# Altium footprint library UP-ROBOT Devices(2013-02-26).PcbLib: 150 footprints (part 6 of 10)
Each footprint in its own frame and in the unit in brackets; x right, y up, seen from the top. Pads: shape width x height; smd on the part's side, far side on the other; paste and mask are expansions set on the pad; w line width, h text height; cw(c..) or ccw(c..) is an arc to the next point about the centre after c.
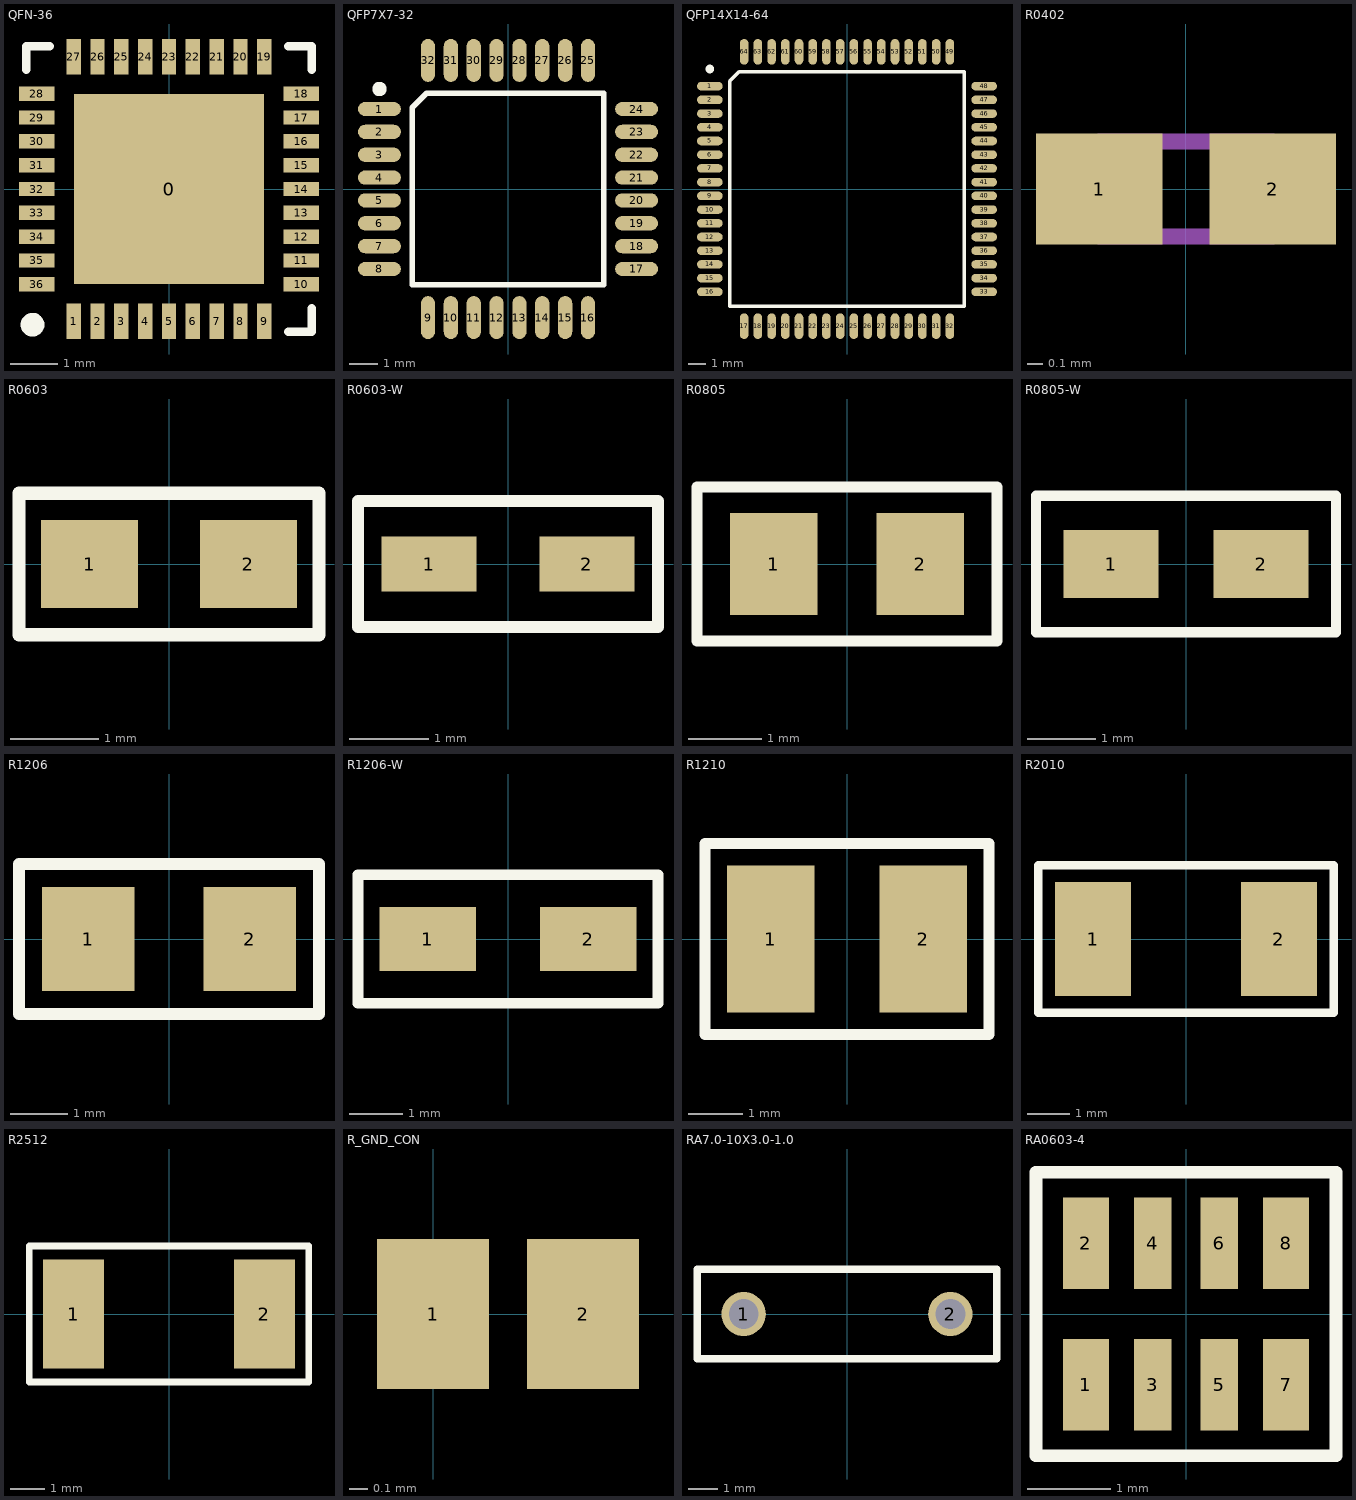
[diagram p5: the footprints below, top view; thin cyan lines are the x and y axes]

## QFN-36 [mm]
pads (37):
  rect 4x4 smd: 0(0,0)
  rect 0.3x0.75 smd: 1(-2,-2.775) 2(-1.5,-2.775) 3(-1,-2.775) 4(-0.5,-2.775) 5(0,-2.775) 6(0.5,-2.775) 7(1,-2.775) 8(1.5,-2.775) 9(2,-2.775) 19(2,2.775) 20(1.5,2.775) 21(1,2.775) 22(0.5,2.775) 23(0,2.775) 24(-0.5,2.775) 25(-1,2.775) 26(-1.5,2.775) 27(-2,2.775)
  rect 0.75x0.3 smd: 10(2.775,-2) 11(2.775,-1.5) 12(2.775,-1) 13(2.775,-0.5) 14(2.775,0) 15(2.775,0.5) 16(2.775,1) 17(2.775,1.5) 18(2.775,2) 28(-2.775,2) 29(-2.775,1.5) 30(-2.775,1) 31(-2.775,0.5) 32(-2.775,0) 33(-2.775,-0.5) 34(-2.775,-1) 35(-2.775,-1.5) 36(-2.775,-2)
Top Overlay:
  circle w0.25: c-2.865,-2.85 r0.125
  lines w0.178: -3,2.5 -3,3 -2.5,3 ; 2.5,-3 3,-3 3,-2.5 ; 2.5,3 3,3 3,2.5
3D body: height 0.9, standoff 0.01, extent -3.102,-3.102 3.103,3.103

## QFP7X7-32 [mm]
pads (32):
  oval 1.5x0.5 smd: 1(-4.5,2.8) 2(-4.5,2) 3(-4.5,1.2) 4(-4.5,0.4) 5(-4.5,-0.4) 6(-4.5,-1.2) 7(-4.5,-2) 8(-4.5,-2.8) 17(4.5,-2.8) 18(4.5,-2) 19(4.5,-1.2) 20(4.5,-0.4) 21(4.5,0.4) 22(4.5,1.2) 23(4.5,2) 24(4.5,2.8)
  oval 0.5x1.5 smd: 9(-2.8,-4.5) 10(-2,-4.5) 11(-1.2,-4.5) 12(-0.4,-4.5) 13(0.4,-4.5) 14(1.2,-4.5) 15(2,-4.5) 16(2.8,-4.5) 25(2.8,4.5) 26(2,4.5) 27(1.2,4.5) 28(0.4,4.5) 29(-0.4,4.5) 30(-1.2,4.5) 31(-2,4.5) 32(-2.8,4.5)
Top Overlay:
  circle w0.25: c-4.5,3.5 r0.125
  lines w0.2: -3.35,-3.35 3.35,-3.35 3.35,3.35 -2.85,3.35 -3.35,2.85 -3.35,-3.35
3D body: height 1.75, standoff -0.06, extent -4.5,-4.492 4.5,4.508

## QFP14X14-64 [mm]
pads (64):
  oval 1.5x0.5 smd: 1(-8,6) 2(-8,5.2) 3(-8,4.4) 4(-8,3.6) 5(-8,2.8) 6(-8,2) 7(-8,1.2) 8(-8,0.4) 9(-8,-0.4) 10(-8,-1.2) 11(-8,-2) 12(-8,-2.8) 13(-8,-3.6) 14(-8,-4.4) 15(-8,-5.2) 16(-8,-6) 33(8,-6) 34(8,-5.2) 35(8,-4.4) 36(8,-3.6) 37(8,-2.8) 38(8,-2) 39(8,-1.2) 40(8,-0.4) 41(8,0.4) 42(8,1.2) 43(8,2) 44(8,2.8) 45(8,3.6) 46(8,4.4) 47(8,5.2) 48(8,6)
  oval 0.5x1.5 smd: 17(-6,-8) 18(-5.2,-8) 19(-4.4,-8) 20(-3.6,-8) 21(-2.8,-8) 22(-2,-8) 23(-1.2,-8) 24(-0.4,-8) 25(0.4,-8) 26(1.2,-8) 27(2,-8) 28(2.8,-8) 29(3.6,-8) 30(4.4,-8) 31(5.2,-8) 32(6,-8) 49(6,8) 50(5.2,8) 51(4.4,8) 52(3.6,8) 53(2.8,8) 54(2,8) 55(1.2,8) 56(0.4,8) 57(-0.4,8) 58(-1.2,8) 59(-2,8) 60(-2.8,8) 61(-3.6,8) 62(-4.4,8) 63(-5.2,8) 64(-6,8)
Top Overlay:
  circle w0.25: c-8,7 r0.125
  lines w0.2: -6.85,-6.85 -6.85,6.3 -6.3,6.85 6.85,6.85 6.85,-6.85 -6.85,-6.85
3D body: height 1.75, standoff -0.06, extent -8.014,-7.988 7.986,8.012

## R0402 [mm]
height 0.5
pads (2):
  rect 0.8x0.7 smd: 1(-0.55,0) 2(0.55,0)
Mechanical 13:
  lines w0.1: -0.55,-0.3 -0.55,0.3 0.55,0.3 0.55,-0.3 -0.55,-0.3
3D body: height 0.3, standoff 0, extent -0.48,-0.25 0.52,0.25

## R0603 [mm]
pads (2):
  rect 1.1x1 smd: 1(-0.9,0) 2(0.9,0)
Top Overlay:
  lines w0.152: -1.7,-0.8 -1.7,0.8 0.152,0.8 1.7,0.8 1.7,-0.8 -1.7,-0.8
3D body: height 0.46, standoff 0, extent -0.787,-0.386 0.737,0.381

## R0603-W [mm]
height 0.762
pads (2):
  rect 1.2x0.7 smd: 1(-1,0) 2(1,0)
Top Overlay:
  lines w0.152: -1.9,-0.8 -1.9,0.8 1.9,0.8 1.9,-0.8 0.483,-0.8 -1.9,-0.8
3D body: height 0.46, standoff 0, extent -0.787,-0.386 0.737,0.381

## R0805 [mm]
pads (2):
  rect 1.2x1.4 smd: 1(-1,0) 2(1,0)
Top Overlay:
  lines w0.152: -2.05,-1.05 2.05,-1.05 2.05,1.05 -2.05,1.05 -2.05,-1.05
3D body: height 0.61, standoff 0, extent -1.016,-0.653 1.016,0.622

## R0805-W [mm]
pads (2):
  rect 1.4x1 smd: 1(-1.1,0) 2(1.1,0)
Top Overlay:
  lines w0.152: -2.2,-1 2.2,-1 2.2,1 -2.2,1 -2.2,-1
3D body: height 0.61, standoff 0, extent -1.016,-0.653 1.016,0.622

## R1206 [mm]
pads (2):
  rect 1.6x1.8 smd: 1(-1.4,0) 2(1.4,0)
Top Overlay:
  lines w0.203: -2.6,-1.3 2.6,-1.3 2.6,1.3 -2.6,1.3 -2.6,-1.3
3D body: height 0.61, standoff 0, extent -1.524,-0.804 1.524,0.725

## R1206-W [mm]
pads (2):
  rect 1.8x1.2 smd: 1(-1.5,0) 2(1.5,0)
Top Overlay:
  lines w0.203: -2.8,-1.2 2.8,-1.2 2.8,1.2 -2.8,1.2 -2.8,-1.2
3D body: height 0.61, standoff 0, extent -1.524,-0.804 1.524,0.725

## R1210 [mm]
pads (2):
  rect 1.6x2.7 smd: 1(-1.4,0) 2(1.4,0)
Top Overlay:
  lines w0.203: -2.6,-1.75 2.6,-1.75 2.6,1.75 -2.6,1.75 -2.6,-1.75

## R2010 [mm]
pads (2):
  rect 1.8x2.7 smd: 1(-2.2,0) 2(2.2,0)
Top Overlay:
  lines w0.203: -3.5,-1.75 3.5,-1.75 3.5,1.75 -3.5,1.75 -3.5,-1.75

## R2512 [mm]
pads (2):
  rect 1.8x3.2 smd: 1(-2.8,0) 2(2.8,0)
Top Overlay:
  lines w0.203: -4.1,-2 4.1,-2 4.1,2 -4.1,2 -4.1,-2
3D body: height 0.61, standoff 0, extent -3.175,-1.525 3.175,1.526

## R_GND_CON [mm]
pads (2):
  rect 0.6x0.8 smd: 1(0,0) 2(0.8,0)

## RA7.0-10X3.0-1.0 [mm]
pads (2):
  round 1.5 hole 1: 1(-3.5,0)
  round 1.5 hole 1.016: 2(3.5,0)
Top Overlay:
  lines w0.254: -5.08,-1.524 -5.08,1.524 5.08,1.524 5.08,-1.524 -5.08,-1.524

## RA0603-4 [mm]
pads (8):
  rect 0.55x1.1 smd: 1(-1.2,-0.85) 2(-1.2,0.85) 7(1.2,-0.85) 8(1.2,0.85)
  rect 0.45x1.1 smd: 3(-0.4,-0.85) 4(-0.4,0.85) 5(0.4,-0.85) 6(0.4,0.85)
Top Overlay:
  lines w0.152: -1.8,-1.7 1.8,-1.7 1.8,1.7 -1.8,1.7 -1.8,-1.7
3D body: height 0.5, standoff 0, extent -1.6,-0.85 1.6,0.85